# Altium schematic symbol library Schlib.SchLib: 725 symbols (part 1 of 6) (continued)
## 501571-2007 (continued)
footprint 5015712007
pins: 1, 2, 3, 4, 5, 6, 7, 8, 9, 10, 11, 12, 13, 14, 15, 16, 17, 18, 19, 20, S1 SHIELD1, S2 SHIELD2

## 501571-3007
designator J?  (value not drawn)
Conn Shrouded Header (4 Sides) HDR 30 POS 1mm Solder RA Side Entry SMD Pico-Clasp™ T/R; Manufacturer: Molex; Manufacturer Part Number: 501571-3007; Plating: 157ConductorMaterial; Gender: 29Gender; Glow Wire Compliant: 16Compliance; Supplier: Rs; Supplier Part Number: 188686; RoHS: Yes; Category: Headers and Wire Housings; Stock: 360; Pricing: 10=1.92 (EUR); Lead Free: 5697LeadFree; Reach SVHC Compliant: 4186SVHC; ComponentLink1URL: https://datasheet.ciiva.com/724/5015712007-sd-724423.pdf?src-supplier=Digikey; ComponentLink1Description: https://datasheet.ciiva.com/724/5015712007-sd-724423.pdf?src-supplier=Digikey; ComponentLink2URL: https://datasheet.ciiva.com/23815/1759768-23815067.pdf?src-supplier=Newark; ComponentLink2Description: https://datasheet.ciiva.com/23815/1759768-23815067.pdf?src-supplier=Newark; ComponentLink3URL: https://datasheet.ciiva.com/5150/5015713007-pcb-headers-179208-5150439.pdf?src-supplier=Mouser; ComponentLink3Description: https://datasheet.ciiva.com/5150/5015713007-pcb-headers-179208-5150439.pdf?src-supplier=Mouser; ComponentLink4URL: https://datasheet.ciiva.com/11749/0900766b80ae4492-11749015.pdf?src-supplier=Rs; ComponentLink4Description: https://datasheet.ciiva.com/11749/0900766b80ae4492-11749015.pdf?src-supplier=Rs; ComponentLink5URL: https://datasheet.ciiva.com/30177/18545015713007-pcb-headers-30177787.pdf?src-supplier=Onlinecomponents.com; ComponentLink5Description: https://datasheet.ciiva.com/30177/18545015713007-pcb-headers-30177787.pdf?src-supplier=Onlinecomponents.com; ComponentLink6URL: https://datasheet.ciiva.com/9469/5015713007-pcb-headers-9469147.pdf?src-supplier=Avnet; ComponentLink6Description: https://datasheet.ciiva.com/9469/5015713007-pcb-headers-9469147.pdf?src-supplier=Avnet
footprint 5015713007
pins: 1, 2, 3, 4, 5, 6, 7, 8, 9, 10, 11, 12, 13, 14, 15, 16, 17, 18, 19, 20, 21, 22, 23, 24, 25, 26, 27, 28, 29, 30, S1 SHIELD1, S2 SHIELD2

## 505066-0622
designator J?  (value not drawn)
Conn Stacking RCP 0.6mm Stack Height 6 POS 0.35mm Solder ST SMD Emboss T/R; Manufacturer: Molex; Manufacturer Part Number: 505066-0622; Supplier: Mouser; Supplier Part Number: 538-505066-0622; RoHS: No; Category: Headers and Wire Housings; Stock: 29893; Pricing: 1=0.32, 10=0.229, 50=0.229, 100=0.198, 1000=0.172, 10000=0.136 (USD)
footprint 5050660622
pins: 1, 2, 3, 4, 5, 6, MP1, MP2, MP3, MP4
text: On Board

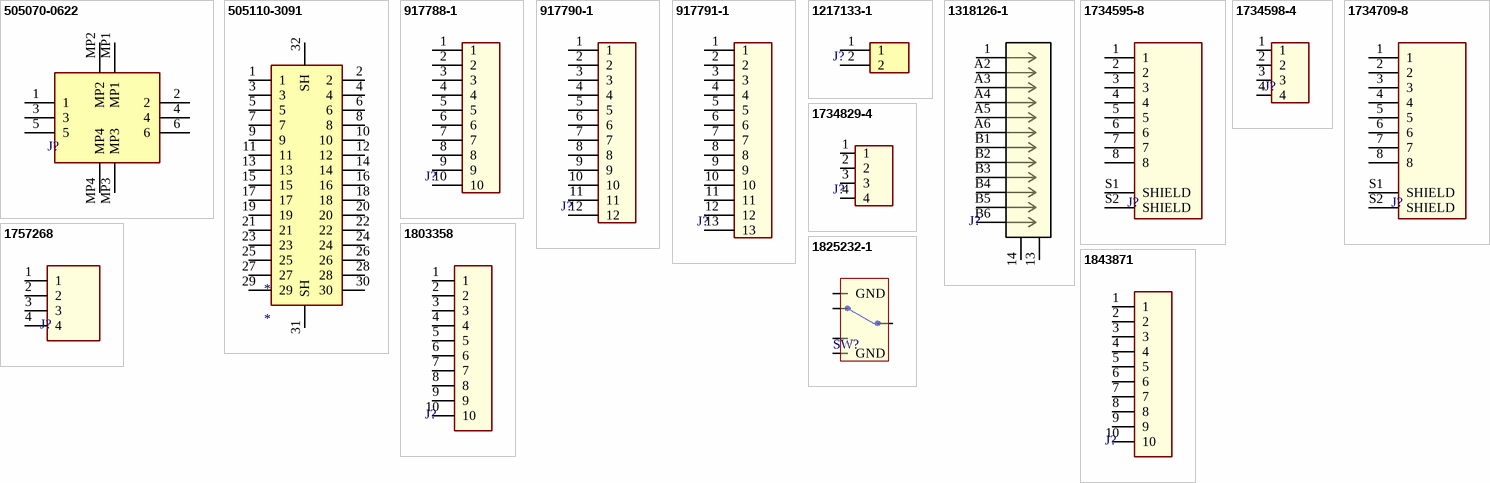
[diagram p1: symbols 505070-0622 to 1843871]

## 505070-0622
designator J?  (value not drawn)
Conn Board to Board PL 6 POS 0.35mm Solder ST Top Entry SMD SlimStack™ T/R; Manufacturer: Molex; Manufacturer Part Number: 505070-0622; Supplier: Mouser; Supplier Part Number: 538-505070-0622; RoHS: No; Category: Headers and Wire Housings; Stock: 110941; Pricing: 1=0.38, 10=0.23, 50=0.23, 100=0.192, 1000=0.167, 10000=0.132 (USD)
footprint 5050700622
pins: 1, 2, 3, 4, 5, 6, MP1, MP2, MP3, MP4

## 505110-3091
designator *
Conn FFC/FPC Connector SKT 30 POS 0.5mm Solder RA SMD Embossed T/R; Manufacturer: Molex; Manufacturer Part Number: 505110-3091; Supplier: Mouser; Supplier Part Number: 538-505110-3091; RoHS: No; Stock: 6358; Pricing: 1=1.15, 10=0.785, 50=0.785, 100=0.649, 1000=0.589, 10000=0.513 (USD); ComponentLink1URL: http://datasheet.octopart.com/5051103091-Molex-datasheet-38188819.pdf?src-supplier=Mouser; ComponentLink1Description: http://datasheet.octopart.com/5051103091-Molex-datasheet-38188819.pdf?src-supplier=Mouser; ComponentLink2URL: http://datasheet.octopart.com/5051103091-Molex-datasheet-38188819.pdf?src-supplier=Newark; ComponentLink2Description: http://datasheet.octopart.com/5051103091-Molex-datasheet-38188819.pdf?src-supplier=Newark; ComponentLink3URL: http://datasheet.octopart.com/5051103091-Molex-datasheet-38188819.pdf?src-supplier=Allied+Electronics; ComponentLink3Description: http://datasheet.octopart.com/5051103091-Molex-datasheet-38188819.pdf?src-supplier=Allied+Electronics; ComponentLink4URL: http://datasheet.octopart.com/5051103091-Molex-datasheet-38188819.pdf?src-supplier=Onlinecomponents.com; ComponentLink4Description: http://datasheet.octopart.com/5051103091-Molex-datasheet-38188819.pdf?src-supplier=Onlinecomponents.com; ComponentLink5URL: http://datasheet.octopart.com/5051103091-Molex-datasheet-38188819.pdf?src-supplier=Verical; ComponentLink5Description: http://datasheet.octopart.com/5051103091-Molex-datasheet-38188819.pdf?src-supplier=Verical; ComponentLink6URL: http://datasheet.octopart.com/5051103091-Molex-datasheet-38188819.pdf?src-supplier=Digikey; ComponentLink6Description: http://datasheet.octopart.com/5051103091-Molex-datasheet-38188819.pdf?src-supplier=Digikey; ComponentLink7URL: http://datasheet.octopart.com/5051103091-Molex-datasheet-38188819.pdf?src-supplier=Arrow+Electronics; ComponentLink7Description: http://datasheet.octopart.com/5051103091-Molex-datasheet-38188819.pdf?src-supplier=Arrow+Electronics; ComponentLink8URL: http://datasheet.octopart.com/5051103091-Molex-datasheet-38188819.pdf?src-supplier=Avnet; ComponentLink8Description: http://datasheet.octopart.com/5051103091-Molex-datasheet-38188819.pdf?src-supplier=Avnet; ComponentLink9URL: http://datasheet.octopart.com/5051103091-Molex-datasheet-38188819.pdf?src-supplier=Farnell; ComponentLink9Description: http://datasheet.octopart.com/5051103091-Molex-datasheet-38188819.pdf?src-supplier=Farnell; ComponentLink10URL: https://datasheet.octopart.com/505110-3091-Molex-datasheet-154754677.pdf?src-supplier=Master+Electronics; ComponentLink10Description: https://datasheet.octopart.com/505110-3091-Molex-datasheet-154754677.pdf?src-supplier=Master+Electronics; ComponentLink11URL: http://datasheet.octopart.com/5051103091-Molex-datasheet-38188819.pdf?src-supplier=TTI; ComponentLink11Description: http://datasheet.octopart.com/5051103091-Molex-datasheet-38188819.pdf?src-supplier=TTI; ComponentLink12URL: http://datasheet.octopart.com/5051103091-Molex-datasheet-38188819.pdf?src-supplier=Quest; ComponentLink12Description: http://datasheet.octopart.com/5051103091-Molex-datasheet-38188819.pdf?src-supplier=Quest; ComponentLink13URL: https://datasheet.octopart.com/5051103091-Molex-datasheet-168216843.pdf?src-supplier=TME; ComponentLink13Description: https://datasheet.octopart.com/5051103091-Molex-datasheet-168216843.pdf?src-supplier=TME; ComponentLink14URL: http://datasheet.octopart.com/5051103091-Molex-datasheet-38188819.pdf?src-supplier=Sager+Electronics; ComponentLink14Description: http://datasheet.octopart.com/5051103091-Molex-datasheet-38188819.pdf?src-supplier=Sager+Electronics; ComponentLink15URL: http://datasheet.octopart.com/5051103091-Molex-datasheet-38188819.pdf?src-supplier=Heilind+Electronics; ComponentLink15Description: http://datasheet.octopart.com/5051103091-Molex-datasheet-38188819.pdf?src-supplier=Heilind+Electronics; ComponentLink16URL: http://datasheet.octopart.com/5051103091-Molex-datasheet-38188819.pdf?src-supplier=Electro+Sonic; ComponentLink16Description: http://datasheet.octopart.com/5051103091-Molex-datasheet-38188819.pdf?src-supplier=Electro+Sonic
footprint 5051103091
pins: 1, 2, 3, 4, 5, 6, 7, 8, 9, 10, 11, 12, 13, 14, 15, 16, 17, 18, 19, 20, 21, 22, 23, 24, 25, 26, 27, 28, 29, 30, 31 SH, 32 SH

## 917788-1
designator J?  (value not drawn)
Conn Shrouded Header HDR 10 POS 2.5mm Solder ST Thru-Hole Loose Piece; Manufacturer: TE Connectivity / AMP; Manufacturer Part Number: 917788-1; Circuit Application: Signal; Connector System: Wire-to-Board; Connector Type: Header, Receptacle, Tab; Contact Current Rating: 3A; Contact Style: Straight; Gender: Male; Mating Post Length: 4.572mm; Mating Retention: With; Number of Contacts: 10; Number of Ports: 1; Operating Supply Voltage: 250V; PCB Mounting Orientation: Vertical; PCB Thickness: 1.6002mm; Plating Thickness: 799.846nm; Sealable: No; Tail Length: 3.2mm; Underplate Material: Copper; Supplier: DigiKey; Supplier Part Number: A116763-ND; RoHS: Compliant; Category: Headers and Wire Housings; Stock: 1662; Pricing: 1=1.16, 10=0.987, 200=0.79865, 600=0.73905, 1000=0.71288, 5000=0.63638, 10000=0.60604 (USD); China RoHS: Compliant; Color: Natural; Contact Finish Thickness - Mating: 800nm; Contact Gender: Male; Contact Material: Brass; Contact Mating Length: 4.699mm; Contact Plating: Tin; Contact Shape: Square; Current Rating: 3A; ELV: Compliant; Fastening Type: Latch; Flammability Rating: UL94 V-0; Height: 9.8mm; Housing Color: Natural; Housing Material: Nylon; Lifecycle Status: Production; Max Operating Temperature: 105°C; Min Operating Temperature: -30°C; Mounting Technology: Through Hole; Pins: 10; Number of Positions: 10; Number of Rows: 1; Orientation: Vertical; Packaging: Box; PCB Mount Alignment: With; PCB Mount Retention: With; Pitch: 2.5mm; Radiation Hardening: No; REACH SVHC: Yes; Shielding: No; Terminal Pitch: 2.5mm; Termination: Solder; Voltage Rating: 250V; ComponentLink1URL: https://datasheet.octopart.com:443/917788-1-TE-Connectivity-datasheet-180208000.pdf?src-supplier=IHS; ComponentLink1Description: https://datasheet.octopart.com:443/917788-1-TE-Connectivity-datasheet-180208000.pdf?src-supplier=IHS; ComponentLink2URL: https://datasheet.octopart.com:443/917788-1-TE-Connectivity-datasheet-180207995.pdf?src-supplier=IHS; ComponentLink2Description: https://datasheet.octopart.com:443/917788-1-TE-Connectivity-datasheet-180207995.pdf?src-supplier=IHS; ComponentLink3URL: https://datasheet.octopart.com:443/917788-1-Tyco-Electronics-datasheet-11077908.pdf?src-supplier=Farnell; ComponentLink3Description: https://datasheet.octopart.com:443/917788-1-Tyco-Electronics-datasheet-11077908.pdf?src-supplier=Farnell; ComponentLink4URL: https://datasheet.octopart.com:443/917788-1-TE-Connectivity---AMP-datasheet-100428280.pdf?src-supplier=Newark; ComponentLink4Description: https://datasheet.octopart.com:443/917788-1-TE-Connectivity---AMP-datasheet-100428280.pdf?src-supplier=Newark; ComponentLink5URL: https://sigma.octopart.com:443/62303872/technical_drawing/TE-Connectivity-917788-1.pdf?src-supplier=Sager+Electronics; ComponentLink5Description: https://sigma.octopart.com:443/62303872/technical_drawing/TE-Connectivity-917788-1.pdf?src-supplier=Sager+Electronics; ComponentLink6URL: https://datasheet.octopart.com:443/917788-1-TE-Connectivity---AMP-datasheet-79836788.pdf?src-supplier=TE+Connectivity; ComponentLink6Description: https://datasheet.octopart.com:443/917788-1-TE-Connectivity---AMP-datasheet-79836788.pdf?src-supplier=TE+Connectivity; ComponentLink7URL: https://sigma.octopart.com:443/15000985/technical_drawing/TE-Connectivity---AMP-917788-1.pdf?src-supplier=TE+Connectivity; ComponentLink7Description: https://sigma.octopart.com:443/15000985/technical_drawing/TE-Connectivity---AMP-917788-1.pdf?src-supplier=TE+Connectivity; ComponentLink8URL: https://datasheet.octopart.com:443/917788-1-TE-Connectivity---AMP-datasheet-14999902.pdf?src-supplier=TE+Connectivity; ComponentLink8Description: https://datasheet.octopart.com:443/917788-1-TE-Connectivity---AMP-datasheet-14999902.pdf?src-supplier=TE+Connectivity; ComponentLink9URL: https://sigma.octopart.com:443/14999948/instruction_sheet/TE-Connectivity---AMP-917788-1.pdf?src-supplier=TE+Connectivity; ComponentLink9Description: https://sigma.octopart.com:443/14999948/instruction_sheet/TE-Connectivity---AMP-917788-1.pdf?src-supplier=TE+Connectivity; ComponentLink10URL: https://datasheet.octopart.com:443/917788-1-TE-Connectivity-datasheet-177765414.pdf?src-supplier=Burklin+Elektronik; ComponentLink10Description: https://datasheet.octopart.com:443/917788-1-TE-Connectivity-datasheet-177765414.pdf?src-supplier=Burklin+Elektronik; ComponentLink11URL: http://sigma.octopart.com:80/15000983/rohs_certificate/TE-Connectivity---AMP-917788-1.pdf?src-supplier=Compliance+Statements; ComponentLink11Description: http://sigma.octopart.com:80/15000983/rohs_certificate/TE-Connectivity---AMP-917788-1.pdf?src-supplier=Compliance+Statements; ComponentLink12URL: http://sigma.octopart.com:80/38869033/materials_sheet/AMP-917788-1.pdf?src-supplier=Compliance+Statements; ComponentLink12Description: http://sigma.octopart.com:80/38869033/materials_sheet/AMP-917788-1.pdf?src-supplier=Compliance+Statements; ComponentLink13URL: http://sigma.octopart.com:80/78338689/materials_sheet/TE-Connectivity-917788-1.pdf?src-supplier=Compliance+Statements; ComponentLink13Description: http://sigma.octopart.com:80/78338689/materials_sheet/TE-Connectivity-917788-1.pdf?src-supplier=Compliance+Statements
footprint 917788-1
pins: 1, 2, 3, 4, 5, 6, 7, 8, 9, 10

## 917790-1
designator J?  (value not drawn)
Conn Shrouded Header HDR 12 POS 2.5mm Solder ST Thru-Hole Loose Piece; Manufacturer: TE Connectivity; Manufacturer Part Number: 917790-1; Manufacturer Lifecycle Status: ACTIVE; Circuit Application: Signal; Connector System: Wire-to-Board; Connector Type: Header, Receptacle, Tab; Contact Current Rating: 3A; Contact Style: Straight; Gender: Male; Mating Post Length: 4.572mm; Mating Retention: With; Number of Contacts: 12; Number of Ports: 1; Operating Supply Voltage: 250V; PCB Mounting Orientation: Vertical; PCB Thickness: 1.6002mm; Plating Thickness: 799.846nm; Sealable: No; Tail Length: 3.2mm; Underplate Material: Copper; Supplier: Farnell; Supplier Part Number: 4310844; RoHS: Compliant; Category: Headers and Wire Housings; Stock: 704; Pricing: 150=1.14, 450=0.99 (GBP); China RoHS: Compliant; Color: Natural; Contact Finish Thickness - Mating: 800nm; Contact Gender: Male; Contact Material: Brass; Contact Mating Length: 4.699mm; Contact Plating: Tin; Contact Shape: Square; Current Rating: 3A; ELV: Compliant; Fastening Type: Latch; Flammability Rating: UL94 V-0; Height: 9.8mm; Housing Color: Natural; Housing Material: Nylon; Length: 32.5mm; Lifecycle Status: Production; Max Operating Temperature: 105°C; Min Operating Temperature: -30°C; Mounting Technology: Through Hole; Pins: 12; Number of Positions: 12; Number of Rows: 1; Orientation: Vertical; Packaging: Box; PCB Mount Alignment: With; PCB Mount Retention: With; Pitch: 2.5mm; Radiation Hardening: No; REACH SVHC: Yes; Shielding: No; Terminal Pitch: 2.5mm; Termination: Solder; Voltage Rating: 250V; ComponentLink1URL: https://datasheet.octopart.com:443/917790-1-TE-Connectivity-datasheet-100428280.pdf?src-supplier=Master+Electronics; ComponentLink1Description: https://datasheet.octopart.com:443/917790-1-TE-Connectivity-datasheet-100428280.pdf?src-supplier=Master+Electronics; ComponentLink2URL: https://datasheet.octopart.com:443/917790-1-TE-Connectivity-datasheet-79836788.pdf?src-supplier=Master+Electronics; ComponentLink2Description: https://datasheet.octopart.com:443/917790-1-TE-Connectivity-datasheet-79836788.pdf?src-supplier=Master+Electronics; ComponentLink3URL: https://datasheet.octopart.com:443/917790-1-TE-Connectivity---AMP-datasheet-111045614.pdf?src-supplier=IHS; ComponentLink3Description: https://datasheet.octopart.com:443/917790-1-TE-Connectivity---AMP-datasheet-111045614.pdf?src-supplier=IHS; ComponentLink4URL: https://datasheet.octopart.com:443/917790-1-TE-Connectivity-datasheet-11077908.pdf?src-supplier=JRH+Electronics; ComponentLink4Description: https://datasheet.octopart.com:443/917790-1-TE-Connectivity-datasheet-11077908.pdf?src-supplier=JRH+Electronics; ComponentLink5URL: https://sigma.octopart.com:443/99347633/technical_drawing/TE-Connectivity-917790-1.pdf?src-supplier=Sager+Electronics; ComponentLink5Description: https://sigma.octopart.com:443/99347633/technical_drawing/TE-Connectivity-917790-1.pdf?src-supplier=Sager+Electronics; ComponentLink6URL: https://datasheet.octopart.com:443/917790-1-TE-Connectivity---AMP-datasheet-14999902.pdf?src-supplier=TE+Connectivity; ComponentLink6Description: https://datasheet.octopart.com:443/917790-1-TE-Connectivity---AMP-datasheet-14999902.pdf?src-supplier=TE+Connectivity; ComponentLink7URL: https://sigma.octopart.com:443/15001003/technical_drawing/TE-Connectivity-917790-1.pdf?src-supplier=TE+Connectivity; ComponentLink7Description: https://sigma.octopart.com:443/15001003/technical_drawing/TE-Connectivity-917790-1.pdf?src-supplier=TE+Connectivity; ComponentLink8URL: https://sigma.octopart.com:443/14999948/instruction_sheet/TE-Connectivity-917790-1.pdf?src-supplier=TE+Connectivity; ComponentLink8Description: https://sigma.octopart.com:443/14999948/instruction_sheet/TE-Connectivity-917790-1.pdf?src-supplier=TE+Connectivity; ComponentLink9URL: https://datasheet.octopart.com:443/917790-1-TE-Connectivity---AMP-datasheet-154842449.pdf?src-supplier=Electro+Sonic; ComponentLink9Description: https://datasheet.octopart.com:443/917790-1-TE-Connectivity---AMP-datasheet-154842449.pdf?src-supplier=Electro+Sonic; ComponentLink10URL: https://datasheet.octopart.com:443/917790-1-TE-Connectivity-datasheet-177765420.pdf?src-supplier=Burklin+Elektronik; ComponentLink10Description: https://datasheet.octopart.com:443/917790-1-TE-Connectivity-datasheet-177765420.pdf?src-supplier=Burklin+Elektronik; ComponentLink11URL: http://sigma.octopart.com:80/38869035/materials_sheet/TE-Connectivity-917790-1.pdf?src-supplier=Compliance+Statements; ComponentLink11Description: http://sigma.octopart.com:80/38869035/materials_sheet/TE-Connectivity-917790-1.pdf?src-supplier=Compliance+Statements; ComponentLink12URL: http://sigma.octopart.com:80/136763963/materials_sheet/TE-Connectivity-917790-1.pdf?src-supplier=Compliance+Statements; ComponentLink12Description: http://sigma.octopart.com:80/136763963/materials_sheet/TE-Connectivity-917790-1.pdf?src-supplier=Compliance+Statements; ComponentLink13URL: http://sigma.octopart.com:80/15001000/rohs_certificate/TE-Connectivity---AMP-917790-1.pdf?src-supplier=Compliance+Statements; ComponentLink13Description: http://sigma.octopart.com:80/15001000/rohs_certificate/TE-Connectivity---AMP-917790-1.pdf?src-supplier=Compliance+Statements
footprint 917790-1
pins: 1, 2, 3, 4, 5, 6, 7, 8, 9, 10, 11, 12

## 917791-1
designator J?  (value not drawn)
Conn Shrouded Header HDR 13 POS 2.5mm Solder ST Thru-Hole Loose Piece; Manufacturer: TE Connectivity / AMP; Manufacturer Part Number: 917791-1; Circuit Application: Signal; Connector System: Wire-to-Board; Connector Type: Header, Receptacle, Tab; Contact Current Rating: 3A; Contact Style: Straight; Gender: Male; Mating Post Length: 4.572mm; Mating Retention: With; Number of Contacts: 13; Number of Ports: 1; Operating Supply Voltage: 250V; PCB Mounting Orientation: Vertical; PCB Thickness: 1.6002mm; Plating Thickness: 799.846nm; Sealable: No; Tail Length: 3.2mm; Underplate Material: Copper; Supplier: DigiKey; Supplier Part Number: A116765-ND; RoHS: Compliant; Category: Headers and Wire Housings; Stock: 917; Pricing: 1=1.29, 10=1.093, 100=0.9289, 500=0.82908, 1000=0.78951, 5000=0.70479, 10000=0.67119 (USD); China RoHS: Compliant; Color: Natural; Contact Finish Thickness - Mating: 800nm; Contact Gender: Male; Contact Material: Brass; Contact Mating Length: 4.699mm; Contact Plating: Tin; Contact Shape: Square; Current Rating: 3A; ELV: Compliant; Fastening Type: Latch; Flammability Rating: UL94 V-0; Height: 9.8mm; Housing Color: Natural; Housing Material: Nylon; Length: 35mm; Lifecycle Status: Production; Max Operating Temperature: 105°C; Min Operating Temperature: -30°C; Mounting Technology: Through Hole; Pins: 13; Number of Positions: 13; Number of Rows: 1; Orientation: Vertical; PCB Mount Alignment: With; PCB Mount Retention: With; Pitch: 2.5mm; Radiation Hardening: No; REACH SVHC: Yes; Shielding: No; Terminal Pitch: 2.5mm; Termination: Solder; Voltage Rating: 250V; ComponentLink1URL: https://datasheet.octopart.com:443/917791-1-TE-Connectivity-datasheet-180208006.pdf?src-supplier=IHS; ComponentLink1Description: https://datasheet.octopart.com:443/917791-1-TE-Connectivity-datasheet-180208006.pdf?src-supplier=IHS; ComponentLink2URL: https://datasheet.octopart.com:443/917791-1-TE-Connectivity---AMP-datasheet-100428280.pdf?src-supplier=Newark; ComponentLink2Description: https://datasheet.octopart.com:443/917791-1-TE-Connectivity---AMP-datasheet-100428280.pdf?src-supplier=Newark; ComponentLink3URL: https://datasheet.octopart.com:443/917791-1-TE-Connectivity---AMP-datasheet-11077908.pdf?src-supplier=TE+Connectivity; ComponentLink3Description: https://datasheet.octopart.com:443/917791-1-TE-Connectivity---AMP-datasheet-11077908.pdf?src-supplier=TE+Connectivity; ComponentLink4URL: https://datasheet.octopart.com:443/917791-1-TE-Connectivity---AMP-datasheet-79836788.pdf?src-supplier=TE+Connectivity; ComponentLink4Description: https://datasheet.octopart.com:443/917791-1-TE-Connectivity---AMP-datasheet-79836788.pdf?src-supplier=TE+Connectivity; ComponentLink5URL: https://datasheet.octopart.com:443/917791-1-TE-Connectivity---AMP-datasheet-14999902.pdf?src-supplier=TE+Connectivity; ComponentLink5Description: https://datasheet.octopart.com:443/917791-1-TE-Connectivity---AMP-datasheet-14999902.pdf?src-supplier=TE+Connectivity; ComponentLink6URL: https://datasheet.octopart.com:443/917791-1-TE-Connectivity---AMP-datasheet-14999907.pdf?src-supplier=TE+Connectivity; ComponentLink6Description: https://datasheet.octopart.com:443/917791-1-TE-Connectivity---AMP-datasheet-14999907.pdf?src-supplier=TE+Connectivity; ComponentLink7URL: https://sigma.octopart.com:443/14999948/instruction_sheet/TE-Connectivity---AMP-917791-1.pdf?src-supplier=TE+Connectivity; ComponentLink7Description: https://sigma.octopart.com:443/14999948/instruction_sheet/TE-Connectivity---AMP-917791-1.pdf?src-supplier=TE+Connectivity; ComponentLink8URL: https://sigma.octopart.com:443/15001016/technical_drawing/TE-Connectivity---AMP-917791-1.pdf?src-supplier=Sager+Electronics; ComponentLink8Description: https://sigma.octopart.com:443/15001016/technical_drawing/TE-Connectivity---AMP-917791-1.pdf?src-supplier=Sager+Electronics; ComponentLink9URL: http://sigma.octopart.com:80/15001015/rohs_certificate/TE-Connectivity---AMP-917791-1.pdf?src-supplier=Compliance+Statements; ComponentLink9Description: http://sigma.octopart.com:80/15001015/rohs_certificate/TE-Connectivity---AMP-917791-1.pdf?src-supplier=Compliance+Statements; ComponentLink10URL: http://sigma.octopart.com:80/38869036/materials_sheet/AMP-917791-1.pdf?src-supplier=Compliance+Statements; ComponentLink10Description: http://sigma.octopart.com:80/38869036/materials_sheet/AMP-917791-1.pdf?src-supplier=Compliance+Statements
footprint 917791-1
pins: 1, 2, 3, 4, 5, 6, 7, 8, 9, 10, 11, 12, 13

## 1217133-1
designator J?  (value not drawn)
Quick Disconnect Terminal Tab 12.45mm 7.92mm Tin Automotive Reel; Manufacturer: TE Connectivity; Manufacturer Part Number: 1217133-1; Supplier: Onlinecomponents.com; Supplier Part Number: 1217133-1; RoHS: Yes; Category: Terminals; Stock: 68000; Pricing: 10000=0.0324, 30000=0.0321, 50000=0.0318, 100000=0.0314, 150000=0.0311, 250000=0.0308, 500000=0.0305 (USD); ComponentLink1URL: https://datasheet.ciiva.com/16301/eng-cs-82004-faston-pcb-tabs-receptacles-0311-16301555.pdf?src-supplier=Future+Electronics; ComponentLink1Description: https://datasheet.ciiva.com/16301/eng-cs-82004-faston-pcb-tabs-receptacles-0311-16301555.pdf?src-supplier=Future+Electronics; ComponentLink2URL: https://datasheet.ciiva.com/3144/eng-cs-82004-faston-pcb-tabs-receptacles-1012-3144672.pdf?src-supplier=Avnet; ComponentLink2Description: https://datasheet.ciiva.com/3144/eng-cs-82004-faston-pcb-tabs-receptacles-1012-3144672.pdf?src-supplier=Avnet; ComponentLink3URL: https://datasheet.ciiva.com/839/eng-cd-1217133-g-basefilename-839190.pdf?src-supplier=Digikey; ComponentLink3Description: https://datasheet.ciiva.com/839/eng-cd-1217133-g-basefilename-839190.pdf?src-supplier=Digikey; ComponentLink4URL: https://datasheet.ciiva.com/30183/eng-cat-82004-0706-042-052-30183301.pdf?src-supplier=Onlinecomponents.com; ComponentLink4Description: https://datasheet.ciiva.com/30183/eng-cat-82004-0706-042-052-30183301.pdf?src-supplier=Onlinecomponents.com; ComponentLink5URL: https://datasheet.ciiva.com/839/eng-cd-1217133-g-basefilename-839191.pdf?src-supplier=Digikey; ComponentLink5Description: https://datasheet.ciiva.com/839/eng-cd-1217133-g-basefilename-839191.pdf?src-supplier=Digikey
footprint 1217133-1
pins: 1, 2

## 1318126-1
designator J?  (value not drawn)
Conn Shrouded Header (4 Sides) HDR 12 POS 2.5mm Solder ST Top Entry Thru-Hole Tube; Manufacturer: TE Connectivity; Manufacturer Part Number: 1318126-1; Manufacturer Lifecycle Status: ACTIVE; Approvals: UL; Connector System: Wire-to-Board; Connector Type: Header, Plug, Tab; Contact Current Rating: 5A; Contact Retention: Without; Contact Style: Straight; Gender: Male; Insulation Resistance: 100MΩ; Mating Alignment: With; Max Voltage Rating (AC): 250V; Number of Contacts: 12; Number of Ports: 1; Operating Force: 9.7856N; PCB Mounting Orientation: Vertical; PCB Thickness: 1.6002mm; Pitch: 2.4892mm; Plating Thickness: 381nm; Preloaded: Yes; Row Spacing: 3.7592mm; Sealable: No; Tail Length: 3.4036mm; Supplier: Farnell; Supplier Part Number: 2778364; RoHS: Compliant; Category: Headers and Wire Housings; Stock: 1611; Pricing: 1=3.88, 10=3.33, 100=2.77, 250=2.51, 500=2.41, 1000=2.3 (GBP); China RoHS: Compliant; Color: Black; Contact Gender: Male; Contact Plating: Gold, Tin; Current Rating: 5A; Depth: 13.2mm; Flammability Rating: UL94 V-0; Halogen Free: Halogen Free; Height: 17.79mm; Housing Color: Black; Housing Material: Polyester; Lead Free: Lead Free; Length: 17.6784mm; Lifecycle Status: Production; Mating Retention: With; Max Operating Temperature: 105°C; Min Operating Temperature: -55°C; Mounting Technology: Through Hole; Pins: 12; Number of Positions: 12; Number of Rows: 2; Number of Terminals: 12; Operating Supply Voltage: 250V; Orientation: Vertical; Packaging: Bulk; PCB Mount Retention: With; Radiation Hardening: No; REACH SVHC: Yes; Shielding: No; Terminal Pitch: 2.5mm; Termination: Solder; VDE Tested: No; Voltage Rating: 250V; Voltage Rating (AC): 250V; Width: 9.3472mm; ComponentLink1URL: https://datasheet.octopart.com:443/1318126-1-TE-Connectivity-datasheet-179938823.pdf?src-supplier=IHS; ComponentLink1Description: https://datasheet.octopart.com:443/1318126-1-TE-Connectivity-datasheet-179938823.pdf?src-supplier=IHS; ComponentLink2URL: https://sigma.octopart.com:443/15061231/technical_drawing/TE-Connectivity-1318126-1.pdf?src-supplier=TE+Connectivity; ComponentLink2Description: https://sigma.octopart.com:443/15061231/technical_drawing/TE-Connectivity-1318126-1.pdf?src-supplier=TE+Connectivity; ComponentLink3URL: https://datasheet.octopart.com:443/1318126-1-TE-Connectivity-datasheet-155826164.pdf?src-supplier=TE+Connectivity; ComponentLink3Description: https://datasheet.octopart.com:443/1318126-1-TE-Connectivity-datasheet-155826164.pdf?src-supplier=TE+Connectivity; ComponentLink4URL: https://datasheet.octopart.com:443/1318126-1-TE-Connectivity---AMP-datasheet-15059478.pdf?src-supplier=TE+Connectivity; ComponentLink4Description: https://datasheet.octopart.com:443/1318126-1-TE-Connectivity---AMP-datasheet-15059478.pdf?src-supplier=TE+Connectivity; ComponentLink5URL: https://datasheet.octopart.com:443/1318126-1-TE-Connectivity---AMP-datasheet-15060307.pdf?src-supplier=TE+Connectivity; ComponentLink5Description: https://datasheet.octopart.com:443/1318126-1-TE-Connectivity---AMP-datasheet-15060307.pdf?src-supplier=TE+Connectivity; ComponentLink6URL: https://datasheet.octopart.com:443/1318126-1-TE-Connectivity---AMP-datasheet-15061122.pdf?src-supplier=TE+Connectivity; ComponentLink6Description: https://datasheet.octopart.com:443/1318126-1-TE-Connectivity---AMP-datasheet-15061122.pdf?src-supplier=TE+Connectivity; ComponentLink7URL: https://datasheet.octopart.com:443/1318126-1-TE-Connectivity-datasheet-42633666.pdf?src-supplier=Newark; ComponentLink7Description: https://datasheet.octopart.com:443/1318126-1-TE-Connectivity-datasheet-42633666.pdf?src-supplier=Newark; ComponentLink8URL: https://datasheet.octopart.com:443/1318126-1-TE-Connectivity-datasheet-11080394.pdf?src-supplier=Electro+Sonic; ComponentLink8Description: https://datasheet.octopart.com:443/1318126-1-TE-Connectivity-datasheet-11080394.pdf?src-supplier=Electro+Sonic; ComponentLink9URL: https://datasheet.octopart.com:443/1318126-1-TE-Connectivity---AMP-datasheet-181563238.pdf?src-supplier=Master+Electronics; ComponentLink9Description: https://datasheet.octopart.com:443/1318126-1-TE-Connectivity---AMP-datasheet-181563238.pdf?src-supplier=Master+Electronics; ComponentLink10URL: https://datasheet.octopart.com:443/1318126-1-AMP-datasheet-176881822.pdf?src-supplier=Burklin+Elektronik; ComponentLink10Description: https://datasheet.octopart.com:443/1318126-1-AMP-datasheet-176881822.pdf?src-supplier=Burklin+Elektronik; ComponentLink11URL: https://datasheet.octopart.com:443/1318126-1-TE-Connectivity---AMP-datasheet-17728730.pdf?src-supplier=Factory+Futures; ComponentLink11Description: https://datasheet.octopart.com:443/1318126-1-TE-Connectivity---AMP-datasheet-17728730.pdf?src-supplier=Factory+Futures; ComponentLink12URL: http://sigma.octopart.com:80/62073900/materials_sheet/TE-Connectivity-1318126-1.pdf?src-supplier=Compliance+Statements; ComponentLink12Description: http://sigma.octopart.com:80/62073900/materials_sheet/TE-Connectivity-1318126-1.pdf?src-supplier=Compliance+Statements; ComponentLink13URL: http://sigma.octopart.com:80/136673703/materials_sheet/TE-Connectivity-1318126-1.pdf?src-supplier=Compliance+Statements; ComponentLink13Description: http://sigma.octopart.com:80/136673703/materials_sheet/TE-Connectivity-1318126-1.pdf?src-supplier=Compliance+Statements; ComponentLink14URL: http://sigma.octopart.com:80/15061257/rohs_certificate/TE-Connectivity---AMP-1318126-1.pdf?src-supplier=Compliance+Statements; ComponentLink14Description: http://sigma.octopart.com:80/15061257/rohs_certificate/TE-Connectivity---AMP-1318126-1.pdf?src-supplier=Compliance+Statements
footprint 1318126-1
pins: 1, 13, 14, A2 2, A3 3, A4 4, A5 5, A6 6, B1 7, B2 8, B3 9, B4 10, B5 11, B6 12

## 1734595-8
designator J?  (value not drawn)
1.0 Wtb Sr Vt Hdr 8 Pos Rohs Compliant: Yes |Te Connectivity 1734595-8; Number of Positions: 8; Connector Type: Plug,Header,Pin; Wire/Cable Type: Discrete; Backwall/Post Interruptions: No (Without); Connector System: Wire-to-Board; Mating Alignment: Yes (With); PCB Mount Retention: With; PCB Mounting Orientation: Vertical; Contact Current Rating: 800mA; Pitch: 0.039inch; Contact Post Length: 0.028inch; Wire/Cable Gauge: 28AWG; Supplier: Mouser; Supplier Part Number: 571-1734595-8; Manufacturer: TE Connectivity; Manufacturer Part Number: 1734595-8; RoHS: Yes; Category: Connectors; Stock: 5118; Pricing: 1=3.46, 10=3.14, 50=3.14, 100=2.77, 1000=2, 10000=1.96 (USD); Mounting Technology: Surface Mount; Color: Natural; Contact Plating: Nickel,Tin,Matte; Contact Material: Bronze; Housing Color: Beige; Housing Material: Thermoplastic; Min Operating Temperature: -67°C; Max Operating Temperature: 221°C; Package Quantity: 1000; Number of Rows: 1; Packaging: Tape and Reel; Contact Gender: Male; Termination: SMD/SMT; Number of Contacts: 8; Orientation: Vertical; Contact Retention: No (Without); Mating Retention: No (Without); PCB Mount Alignment: No (Without); Sealable: No (Without); Selectively Loaded: No (Without); Strain Relief: No (Without); Series: HPI; Contact Type: Male Pin; Length: 10.3mm; Width: 5.1mm; Height: 4.3mm; Radiation Hardening: No; ELV: Compliant; Flammability Rating: UL94 V-0; RoHS Compliant: Yes; ComponentLink1URL: https://datasheet.ciiva.com/732/eng-cd-1734595-a4-732568.pdf?src-supplier=Digi-Key; ComponentLink1Description: https://datasheet.ciiva.com/732/eng-cd-1734595-a4-732568.pdf?src-supplier=Digi-Key; ComponentLink2URL: https://datasheet.ciiva.com/732/eng-cd-1734595-a4-732665.pdf?src-supplier=Digi-Key; ComponentLink2Description: https://datasheet.ciiva.com/732/eng-cd-1734595-a4-732665.pdf?src-supplier=Digi-Key; ComponentLink3URL: https://datasheet.ciiva.com/732/eng-cd-1734595-a4-732442.pdf?src-supplier=Digi-Key; ComponentLink3Description: https://datasheet.ciiva.com/732/eng-cd-1734595-a4-732442.pdf?src-supplier=Digi-Key
footprint 1734595-8
pins: 1, 2, 3, 4, 5, 6, 7, 8, S1 SHIELD, S2 SHIELD

## 1734598-4
designator J?  (value not drawn)
Circular Connector, 1.25 WTB HDR DIP 4 POS; Manufacturer: TE Connectivity; Manufacturer Part Number: 1734598-4; Supplier: Mouser; Supplier Part Number: 571-1734598-4; RoHS: Yes; Category: Connectors; Stock: 3488; Pricing: 1=0.62, 10=0.555, 50=0.555, 100=0.481, 1000=0.426, 10000=0.366 (USD); ComponentLink1URL: https://datasheet.ciiva.com/732/eng-cd-1734598-r1-732423.pdf?src-supplier=Digikey; ComponentLink1Description: https://datasheet.ciiva.com/732/eng-cd-1734598-r1-732423.pdf?src-supplier=Digikey
footprint 1734598-4
pins: 1, 2, 3, 4

## 1734709-8
designator J?  (value not drawn)
Conn High Performance Interconnect PL 8 POS 1mm Solder RA SMD Reel; Manufacturer: TE Connectivity; Manufacturer Part Number: 1734709-8; Number of Positions: 8; Connector Type: Plug,Header,Pin; Wire/Cable Type: Discrete; Backwall/Post Interruptions: No (Without); Connector System: Wire-to-Board; Mating Alignment: Yes (With); PCB Mount Retention: With; PCB Mounting Orientation: Right Angle; Contact Current Rating: 800mA; Pitch: 0.039inch; Contact Post Length: 0.028inch; Wire/Cable Gauge: 28AWG; Supplier: Mouser; Supplier Part Number: 571-1734709-8; RoHS: Yes; Category: Connectors; Stock: 6947; Pricing: 1=1.46, 10=1.34, 50=1.34, 100=1.29, 1000=1.2, 10000=1.06 (USD); Mounting Technology: Surface Mount; Contact Plating: Nickel,Tin,Matte; Color: Natural; Contact Material: Bronze; Housing Color: Natural; Housing Material: Thermoplastic; Min Operating Temperature: -55°C; Max Operating Temperature: 105°C; Packaging: Tape and Reel; Number of Rows: 1; Package Quantity: 1500; Contact Gender: Male; Termination: SMD/SMT; Number of Contacts: 8; Orientation: Right Angle; Contact Retention: No (Without); Mating Retention: No (Without); PCB Mount Alignment: No (Without); Sealable: No (Without); Selectively Loaded: No (Without); Strain Relief: No (Without); Series: HPI; Contact Type: Male Pin; Length: 10.3mm; Width: 4.95mm; Height: 0.114inch; Radiation Hardening: No; ELV: Compliant; Flammability Rating: UL94 V-0; RoHS Compliant: Yes; ComponentLink1URL: https://datasheet.ciiva.com/732/eng-cd-1734709-b1-732454.pdf?src-supplier=Digi-Key; ComponentLink1Description: https://datasheet.ciiva.com/732/eng-cd-1734709-b1-732454.pdf?src-supplier=Digi-Key; ComponentLink2URL: https://datasheet.ciiva.com/732/eng-cd-1734709-b1-732580.pdf?src-supplier=Digi-Key; ComponentLink2Description: https://datasheet.ciiva.com/732/eng-cd-1734709-b1-732580.pdf?src-supplier=Digi-Key; ComponentLink3URL: https://datasheet.ciiva.com/732/eng-cd-1734709-b1-732677.pdf?src-supplier=Digi-Key; ComponentLink3Description: https://datasheet.ciiva.com/732/eng-cd-1734709-b1-732677.pdf?src-supplier=Digi-Key
footprint 1734709-8
pins: 1, 2, 3, 4, 5, 6, 7, 8, S1 SHIELD, S2 SHIELD

## 1734829-4
designator J?  (value not drawn)
Conn Shrouded Header (4 Sides) HDR 4 POS 1.25mm Solder RA Side Entry Thru-Hole Box/Tube; Manufacturer: TE Connectivity; Manufacturer Part Number: 1734829-4; Supplier: Digikey; Supplier Part Number: A99902-ND; RoHS: Yes; Category: Connectors; Stock: 31252; Pricing: 1=0.38, 90=0.27622, 180=0.2635 (USD); ComponentLink1URL: https://datasheet.ciiva.com/732/eng-cd-1734829-a1-732409.pdf?src-supplier=Digikey; ComponentLink1Description: https://datasheet.ciiva.com/732/eng-cd-1734829-a1-732409.pdf?src-supplier=Digikey
footprint 1734829-4
pins: 1, 2, 3, 4

## 1757268
designator J?  (value not drawn)
Strip Terminal Block, 12A, 2.5mm2, 1 Row(s), 1 Deck(s); Manufacturer: Phoenix Contact; Manufacturer Part Number: 1757268; Voltage Rating (DC): 250V; Gender: 29Gender; Supplier: Rs; Supplier Part Number: 1896127; RoHS: Yes; Category: Terminal Blocks; Stock: 470; Pricing: 5=1.622, 125=1.448, 375=1.342, 1000=1.142, 2000=1.09 (EUR); Housing Color: 49Colour; Max Operating Temperature: 70°C; Lead Free: 5697LeadFree; ComponentLink1URL: https://datasheet.ciiva.com/15197/getdatasheetpartid-176352-15197330.pdf?src-supplier=Verical; ComponentLink1Description: https://datasheet.ciiva.com/15197/getdatasheetpartid-176352-15197330.pdf?src-supplier=Verical; ComponentLink2URL: https://datasheet.ciiva.com/795/1757268-795434.pdf?src-supplier=Digikey; ComponentLink2Description: https://datasheet.ciiva.com/795/1757268-795434.pdf?src-supplier=Digikey; ComponentLink3URL: https://datasheet.ciiva.com/7630/1697153-7630841.pdf?src-supplier=Element14; ComponentLink3Description: https://datasheet.ciiva.com/7630/1697153-7630841.pdf?src-supplier=Element14; ComponentLink4URL: https://datasheet.ciiva.com/16096/1757268-16096406.pdf?src-supplier=Onlinecomponents.com; ComponentLink4Description: https://datasheet.ciiva.com/16096/1757268-16096406.pdf?src-supplier=Onlinecomponents.com; ComponentLink5URL: https://datasheet.ciiva.com/29210/569323-da-01-en-grundgehaeuse-1757268-250-st-29210575.pdf?src-supplier=Conrad; ComponentLink5Description: https://datasheet.ciiva.com/29210/569323-da-01-en-grundgehaeuse-1757268-250-st-29210575.pdf?src-supplier=Conrad; ComponentLink6URL: https://datasheet.ciiva.com/16703/70054631-16703596.pdf?src-supplier=Allied+Electronics; ComponentLink6Description: https://datasheet.ciiva.com/16703/70054631-16703596.pdf?src-supplier=Allied+Electronics
footprint 1757268
pins: 1, 2, 3, 4

## 1803358
designator J?  (value not drawn)
Pin Header, 10 Position, 3.81Mm; Gender:header; Pitch Spacing:3.81Mm; No. Of Positions:10Positions; Rated Current:8A; Rated Voltage:160V; Block Orientation:through Hole Right Angle; Product Range:mc Series; Colour:green Rohs Compliant: Yes; Manufacturer: Phoenix Contact; Manufacturer Part Number: 1803358; Supplier: Sager Electronics; Supplier Part Number: 1803358; RoHS: Yes; Category: Terminal Blocks; Stock: 173; Pricing: 1=4.63, 10=4.41, 25=3.86, 50=3.31, 100=3.15, 250=2.99 (USD); ComponentLink1URL: https://datasheet.ciiva.com/15197/getdatasheetpartid-176380-15197461.pdf?src-supplier=Verical; ComponentLink1Description: https://datasheet.ciiva.com/15197/getdatasheetpartid-176380-15197461.pdf?src-supplier=Verical; ComponentLink2URL: https://datasheet.ciiva.com/795/1803358-795509.pdf?src-supplier=Digikey; ComponentLink2Description: https://datasheet.ciiva.com/795/1803358-795509.pdf?src-supplier=Digikey; ComponentLink3URL: https://datasheet.ciiva.com/16096/1803358-16096827.pdf?src-supplier=Onlinecomponents.com; ComponentLink3Description: https://datasheet.ciiva.com/16096/1803358-16096827.pdf?src-supplier=Onlinecomponents.com; ComponentLink4URL: https://datasheet.ciiva.com/29212/740658-da-01-de-leiterplattenstecker-mc-1-5-10-g-3-81-29212086.pdf?src-supplier=Conrad; ComponentLink4Description: https://datasheet.ciiva.com/29212/740658-da-01-de-leiterplattenstecker-mc-1-5-10-g-3-81-29212086.pdf?src-supplier=Conrad; ComponentLink5URL: https://datasheet.ciiva.com/16939/70054548-16939223.pdf?src-supplier=Allied+Electronics; ComponentLink5Description: https://datasheet.ciiva.com/16939/70054548-16939223.pdf?src-supplier=Allied+Electronics; ComponentLink6URL: https://datasheet.ciiva.com/33106/1803358-33106134.pdf?src-supplier=Today+Components; ComponentLink6Description: https://datasheet.ciiva.com/33106/1803358-33106134.pdf?src-supplier=Today+Components
footprint 1803358
pins: 1, 2, 3, 4, 5, 6, 7, 8, 9, 10

## 1825232-1
designator SW?  (value not drawn)
Switch Slide ON None ON SPDT Side Slide 0.2A 30VDC 10000Cycle PC Pins Bracket Mount/Through Hole; Manufacturer: TE Connectivity AMP; Manufacturer Part Number: 1825232-1; Mechanical Life: 10000Cycles; Actuator Material: Nylon; Voltage Rating (DC): 30V; Current Rating: 200mA; Operating Force: 200gf; Contact Style: Non-Shorting; Switch Travel: 2mm; Number of Positions: 2; PCB Mount Retention: With; Switch Function: On-On; Actuator Type: Standard; Actuator Length: 0.118inch; Tail Length: 0.094inch; Supplier: Avnet; Supplier Part Number: 97X7939; RoHS: Yes; Category: Slide Switches; Stock: 7369; Pricing: 1=0.45000, 10=0.43100, 25=0.40900, 100=0.37200, 500=0.32000, 1000=0.26700 (USD); Mounting Technology: Through Hole; Contact Material: Copper Alloy; Contact Plating: Silver; Min Operating Temperature: -20°C; Max Operating Temperature: 70°C; Throw Configuration: SPDT; Package Quantity: 19200; Packaging: Tray; Max Voltage Rating (DC): 30V; Termination: PC Pin; Electrical Life: 10000Cycles; Orientation: Right Angle; Contact Current Rating: 200mA; Type: Switch; Length: 0.3563inch; Width: 4.3mm; ELV: Compliant; Flammability Rating: UL94 HB; RoHS Compliant: Yes; ComponentLink1URL: https://datasheet.ciiva.com/15085/eng-cd-1825232-b2-15085854.pdf?src-supplier=Digi-Key; ComponentLink1Description: https://datasheet.ciiva.com/15085/eng-cd-1825232-b2-15085854.pdf?src-supplier=Digi-Key
footprint 1825232-1
pins: 1, 2, 3, 4 GND, 5 GND

## 1843871
designator J?  (value not drawn)
Pluggable Terminal Blocks 10 Pos 3.5mm pitch T hrough Hole Header; Manufacturer: Phoenix Contact; Manufacturer Part Number: 1843871; Supplier: Mouser; Supplier Part Number: 651-1843871; RoHS: Yes; Category: Terminal Blocks; Stock: 396; Pricing: 1=5.41, 10=5.17, 50=5.05, 100=4.71, 1000=4.25, 10000=4.25 (USD); ComponentLink1URL: https://datasheet.ciiva.com/29209/568244-da-01-en-grundgehaeuse-1843871-100-st-29209616.pdf?src-supplier=Conrad; ComponentLink1Description: https://datasheet.ciiva.com/29209/568244-da-01-en-grundgehaeuse-1843871-100-st-29209616.pdf?src-supplier=Conrad
footprint 1843871
pins: 1, 2, 3, 4, 5, 6, 7, 8, 9, 10

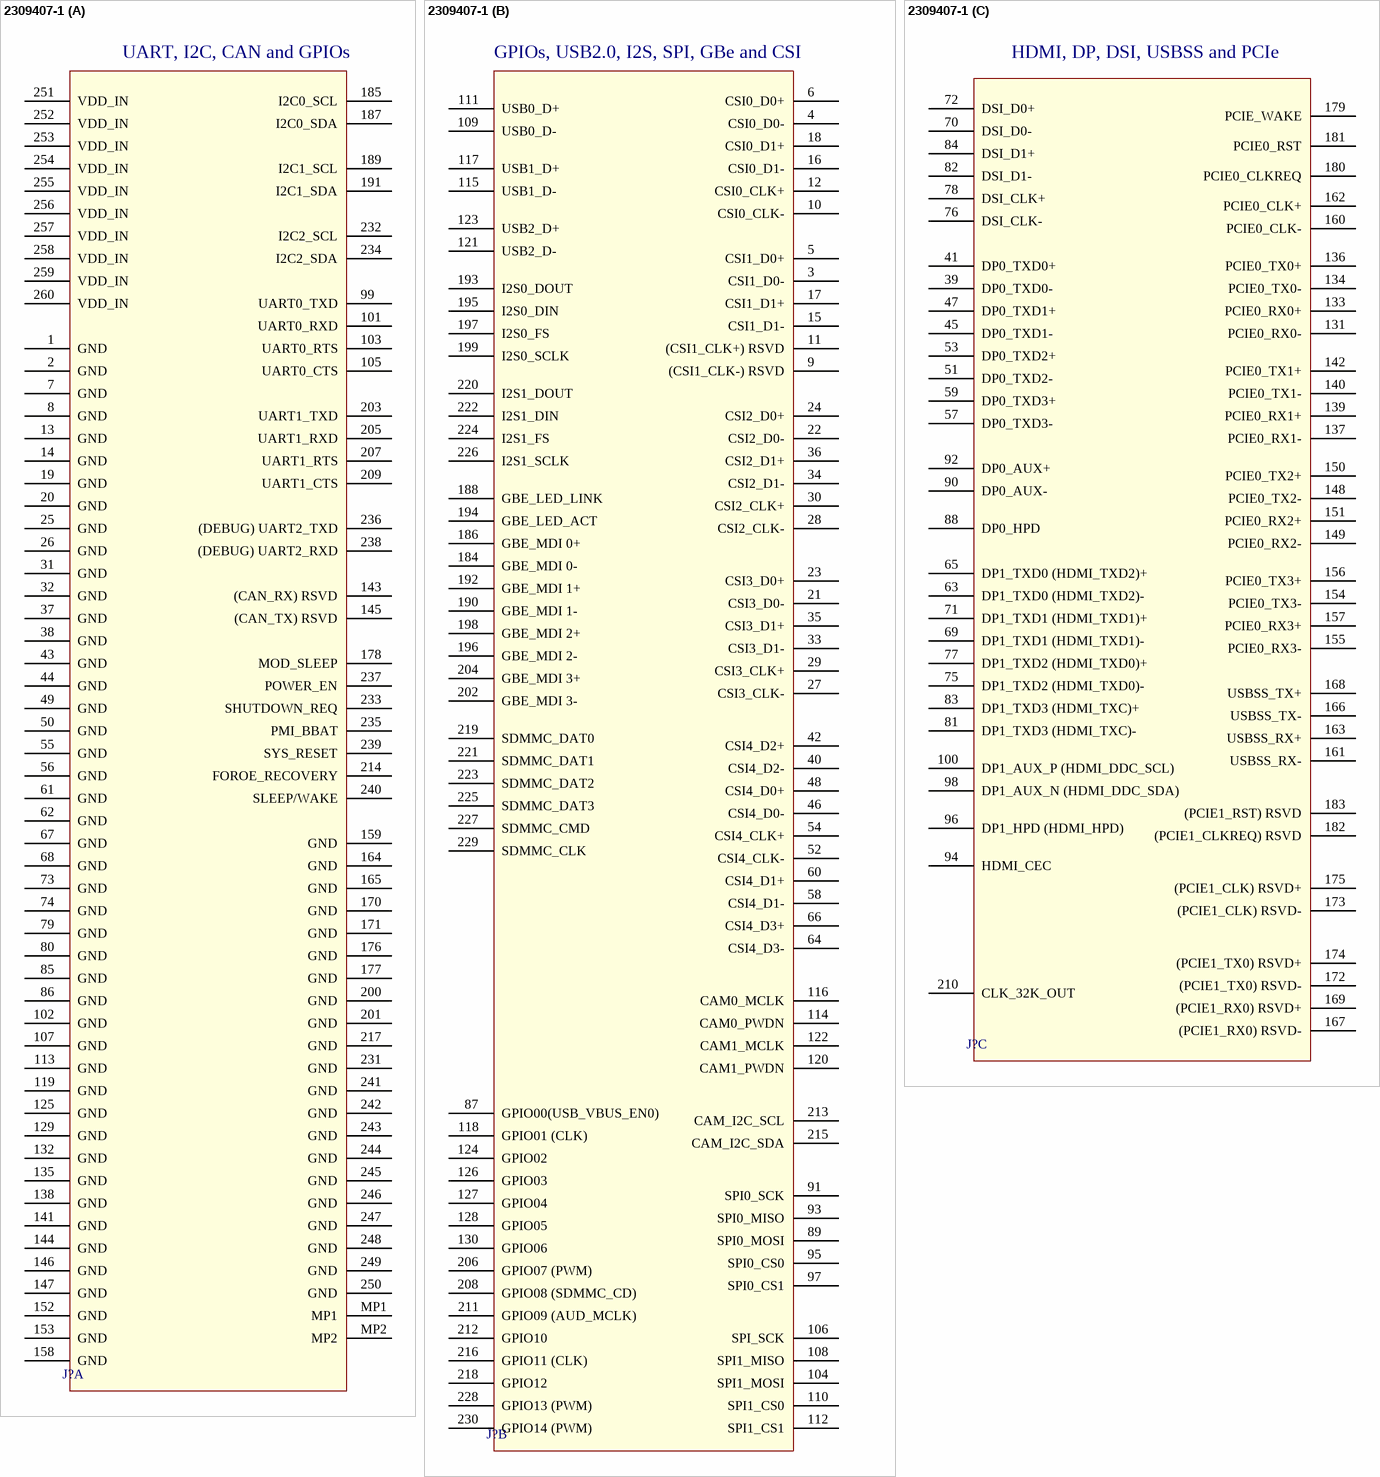
[diagram p2: symbol 2309407-1]
